# Altium footprint library custom-case.PcbLib: 381 footprints (part 14 of 24)
Each footprint in its own frame and in the unit in brackets; x right, y up, seen from the top. Pads: shape width x height; smd on the part's side, far side on the other; paste and mask are expansions set on the pad; w line width, h text height; cw(c..) or ccw(c..) is an arc to the next point about the centre after c.
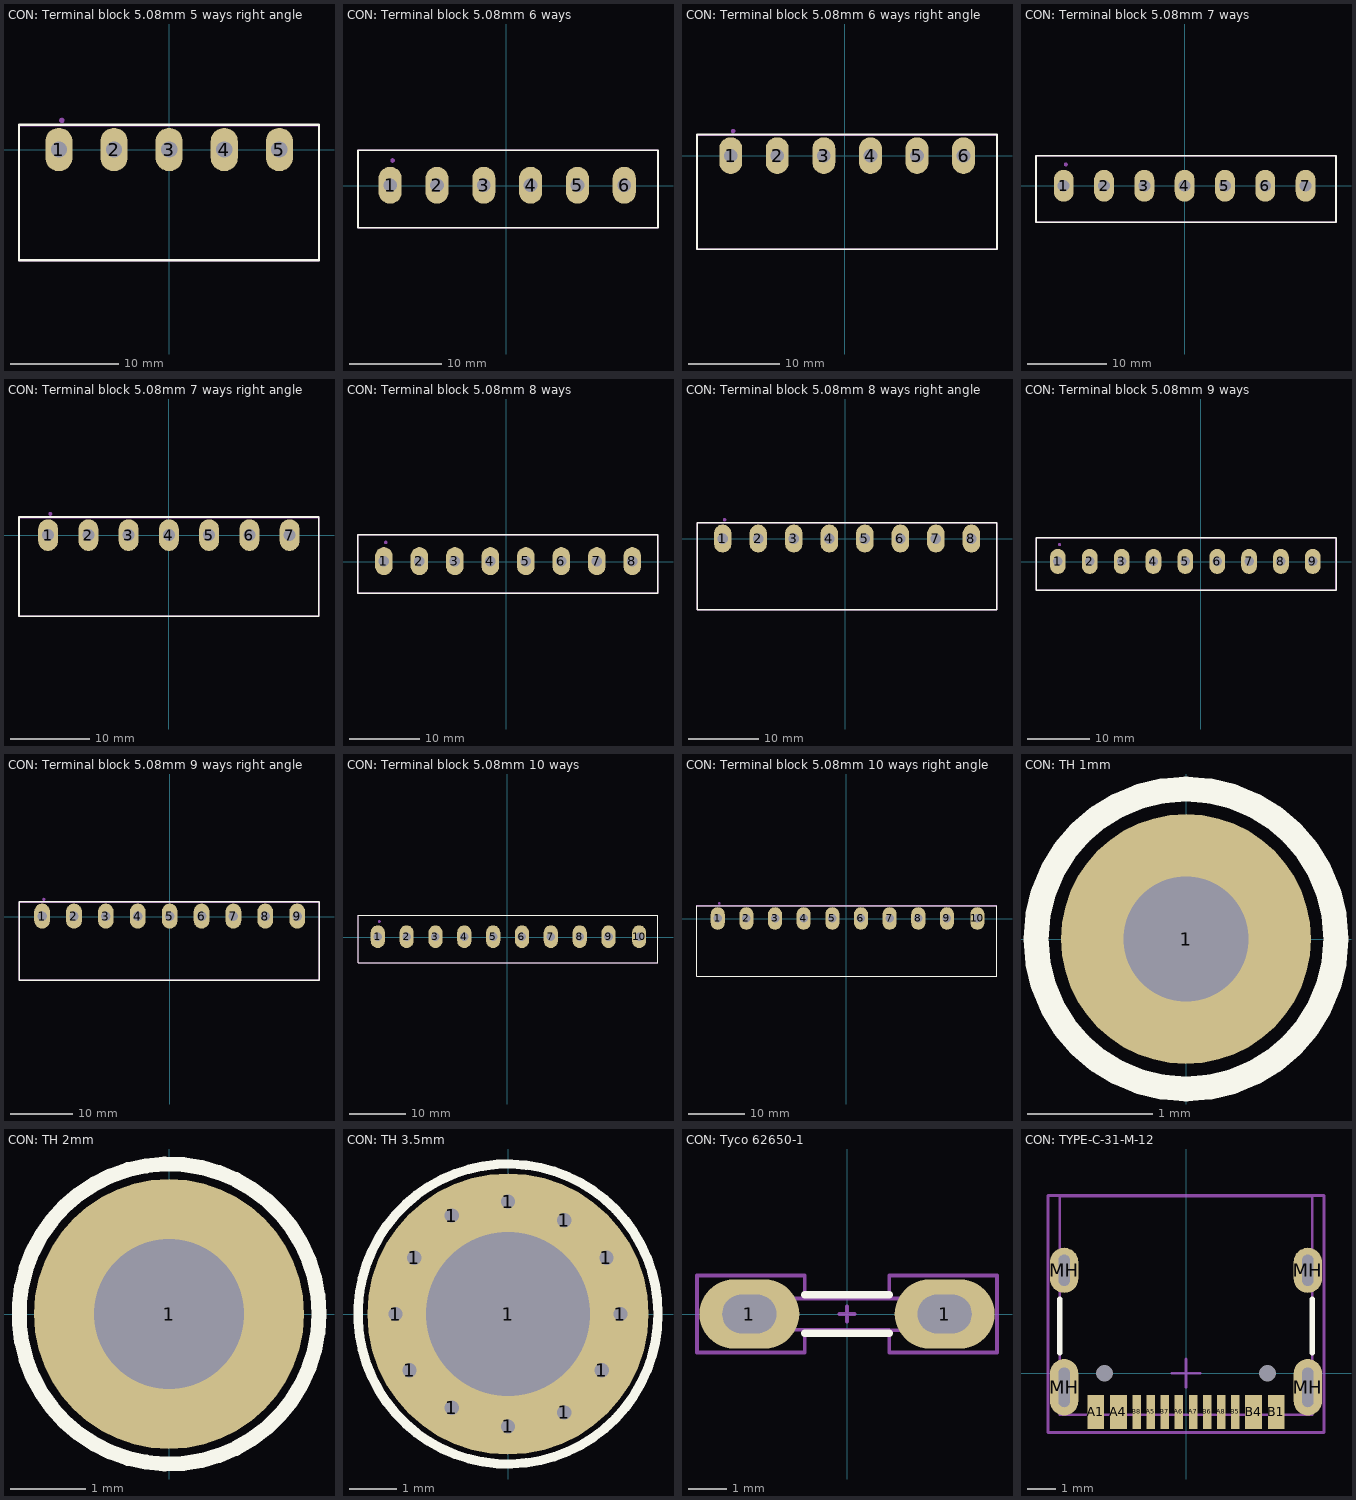
[diagram p13: the footprints below, top view; thin cyan lines are the x and y axes]

## CON: Terminal block 5.08mm 5 ways right angle [mm]
pads (6):
  oval 2.5x4 hole 1.5: 1(-10.16,0) 2(-5.08,0) 3(0,0) 4(5.08,0) 5(10.16,0)
  round 0.5 on Mech1: ""(-9.89,2.683)
Top Overlay:
  lines w0.2: -13.839,-10.213 -13.839,2.29 13.813,2.29 13.813,-10.213 -13.839,-10.213
Top Assy:
  lines w0.1: -13.839,-10.213 -13.839,2.302 13.813,2.302 13.813,-10.213 -13.839,-10.213
Size Area:
  lines w0.2: -13.839,-10.213 13.813,-10.213 13.813,2.228 -13.839,2.228 -13.839,-10.213
3D body "691313510005.stp": height 8.45, standoff -3.55, extent -13.713,-10.017 13.687,1.983

## CON: Terminal block 5.08mm 6 ways [mm]
pads (7):
  oval 2.5x4 hole 1.5: 1(-12.61,0.059) 2(-7.53,0.059) 3(-2.45,0.059) 4(2.63,0.059) 5(7.71,0.059) 6(12.79,0.059)
  round 0.5 on Mech1: ""(-12.34,2.741)
Top Overlay:
  lines w0.2: -16.1,-4.55 16.45,-4.55 16.45,3.85 -16.1,3.85 -16.1,-4.55
Top Assy:
  lines w0.1: -16.1,-4.55 16.45,-4.55 16.45,3.85 -16.1,3.85 -16.1,-4.55
Size Area:
  lines w0.2: -16.1,-4.55 -16.1,3.85 16.45,3.85 16.45,-4.55 -16.1,-4.55
3D body "691311500106.stp": height 12, standoff -4, extent -16.166,-4.633 16.314,3.867

## CON: Terminal block 5.08mm 6 ways right angle [mm]
pads (7):
  oval 2.5x4 hole 1.5: 1(-12.44,0) 2(-7.36,0) 3(-2.28,0) 4(2.8,0) 5(7.88,0) 6(12.96,0)
  round 0.5 on Mech1: ""(-12.17,2.683)
Top Overlay:
  lines w0.2: -16.119,-10.213 -16.119,2.29 16.611,2.29 16.611,-10.213 -16.119,-10.213
Top Assy:
  lines w0.1: -16.119,-10.213 -16.119,2.302 16.611,2.302 16.611,-10.213 -16.119,-10.213
Size Area:
  lines w0.2: -16.119,-10.213 16.611,-10.213 16.611,2.228 -16.119,2.228 -16.119,-10.213
3D body "691313510006.stp": height 8.45, standoff -3.55, extent -15.989,-9.989 16.491,2.011

## CON: Terminal block 5.08mm 7 ways [mm]
pads (8):
  oval 2.5x4 hole 1.5: 1(-15.24,0) 2(-10.16,0) 3(-5.08,0) 4(0,0) 5(5.08,0) 6(10.16,0) 7(15.24,0)
  round 0.5 on Mech1: ""(-14.97,2.683)
Top Overlay:
  lines w0.2: -18.73,-4.609 -18.73,3.791 19.07,3.791 19.07,-4.609 -18.73,-4.609
Top Assy:
  lines w0.1: -18.73,-4.609 -18.73,3.791 19.07,3.791 19.07,-4.609 -18.73,-4.609
Size Area:
  lines w0.2: -18.73,-4.609 19.07,-4.609 19.07,3.791 -18.73,3.791 -18.73,-4.609
3D body "691311500107.stp": height 12, standoff -4, extent -18.776,-4.691 18.784,3.809

## CON: Terminal block 5.08mm 7 ways right angle [mm]
pads (8):
  oval 2.5x4 hole 1.5: 1(-15.24,0) 2(-10.16,0) 3(-5.08,0) 4(0,0) 5(5.08,0) 6(10.16,0) 7(15.24,0)
  round 0.5 on Mech1: ""(-14.97,2.683)
Top Overlay:
  lines w0.2: -18.919,-10.213 -18.919,2.29 18.891,2.29 18.891,-10.213 -18.919,-10.213
Top Assy:
  lines w0.1: -18.919,-10.213 -18.919,2.302 18.944,2.302 18.944,-10.213 -18.919,-10.213
Size Area:
  lines w0.2: -18.919,-10.213 18.891,-10.213 18.891,2.228 -18.919,2.228 -18.919,-10.213
3D body "691313510007.stp": height 8.45, standoff -3.55, extent -18.78,-9.85 18.78,2.15

## CON: Terminal block 5.08mm 8 ways [mm]
pads (9):
  oval 2.5x4 hole 1.5: 1(-17.51,0.059) 2(-12.43,0.059) 3(-7.35,0.059) 4(-2.27,0.059) 5(2.81,0.059) 6(7.89,0.059) 7(12.97,0.059) 8(18.05,0.059)
  round 0.5 on Mech1: ""(-17.24,2.741)
Top Overlay:
  lines w0.2: -21.212,-4.55 -21.212,3.85 21.716,3.85 21.716,-4.55 -21.212,-4.55
Top Assy:
  lines w0.1: -21.212,-4.55 -21.212,3.85 21.733,3.85 21.733,-4.55 -21.212,-4.55
Size Area:
  lines w0.2: -21.212,-4.55 21.724,-4.55 21.724,3.85 -21.212,3.85 -21.212,-4.55
3D body "691311500108.stp": height 12, standoff -4, extent -21.056,-4.685 21.584,3.815

## CON: Terminal block 5.08mm 8 ways right angle [mm]
pads (9):
  oval 2.5x4 hole 1.5: 1(-17.52,0) 2(-12.44,0) 3(-7.36,0) 4(-2.28,0) 5(2.8,0) 6(7.88,0) 7(12.96,0) 8(18.04,0)
  round 0.5 on Mech1: ""(-17.25,2.683)
Top Overlay:
  lines w0.2: -21.199,-10.213 -21.199,2.29 21.7,2.29 21.7,-10.213 -21.199,-10.213
Top Assy:
  lines w0.1: -21.199,-10.213 -21.199,2.302 21.7,2.302 21.7,-10.213 -21.199,-10.213
Size Area:
  lines w0.2: -21.199,-10.213 21.7,-10.213 21.7,2.228 -21.199,2.228 -21.199,-10.213
3D body "691313510008.stp": height 8.45, standoff -3.55, extent -21,-9.85 21.64,2.15

## CON: Terminal block 5.08mm 9 ways [mm]
pads (10):
  oval 2.5x4 hole 1.5: 1(-22.76,0.059) 2(-17.68,0.059) 3(-12.6,0.059) 4(-7.52,0.059) 5(-2.44,0.059) 6(2.64,0.059) 7(7.72,0.059) 8(12.8,0.059) 9(17.88,0.059)
  round 0.5 on Mech1: ""(-22.49,2.741)
Top Overlay:
  lines w0.2: -26.25,-4.55 -26.25,3.85 21.583,3.85 21.583,-4.55 -26.25,-4.55
Top Assy:
  lines w0.1: -26.25,-4.55 -26.25,3.85 21.559,3.85 21.559,-4.55 -26.25,-4.55
Size Area:
  lines w0.2: -26.25,-4.55 21.559,-4.55 21.559,3.85 -26.25,3.85 -26.25,-4.55
3D body "691311500109.stp": height 12, standoff -4, extent -26.25,-4.55 21.47,3.95

## CON: Terminal block 5.08mm 9 ways right angle [mm]
pads (10):
  oval 2.5x4 hole 1.5: 1(-20.31,0.059) 2(-15.23,0.059) 3(-10.15,0.059) 4(-5.07,0.059) 5(0.01,0.059) 6(5.09,0.059) 7(10.17,0.059) 8(15.25,0.059) 9(20.33,0.059)
  round 0.5 on Mech1: ""(-20.04,2.741)
Top Overlay:
  lines w0.2: -23.989,-10.154 -23.989,2.348 23.8,2.348 23.8,-10.154 -23.989,-10.154
Top Assy:
  lines w0.1: -23.989,-10.154 -23.989,2.361 23.8,2.361 23.8,-10.154 -23.989,-10.154
Size Area:
  lines w0.2: -23.989,-10.154 23.8,-10.154 23.8,2.287 -23.989,2.287 -23.989,-10.154
3D body "691313510009.stp": height 8.45, standoff -3.55, extent -23.85,-9.85 23.87,2.15

## CON: Terminal block 5.08mm 10 ways [mm]
pads (11):
  oval 2.5x4 hole 1.5: 1(-22.76,0.059) 2(-17.68,0.059) 3(-12.6,0.059) 4(-7.52,0.059) 5(-2.44,0.059) 6(2.64,0.059) 7(7.72,0.059) 8(12.8,0.059) 9(17.88,0.059) 10(23.28,0.059)
  round 0.5 on Mech1: ""(-22.49,2.741)
Top Overlay:
  lines w0.2: -26.25,-4.55 26.6,-4.55 26.6,3.85 -26.25,3.85 -26.25,-4.55
Top Assy:
  lines w0.1: -26.25,-4.55 26.6,-4.55 26.6,3.85 -26.25,3.85 -26.25,-4.55
Size Area:
  lines w0.2: -26.25,-4.55 -26.25,3.85 26.6,3.85 26.6,-4.55 -26.25,-4.55
3D body "691311500110.stp": height 12, standoff -4, extent -26.334,-4.61 26.466,3.89

## CON: Terminal block 5.08mm 10 ways right angle [mm]
pads (11):
  oval 2.5x4 hole 1.5: 1(-22.76,0.059) 2(-17.68,0.059) 3(-12.6,0.059) 4(-7.52,0.059) 5(-2.44,0.059) 6(2.64,0.059) 7(7.72,0.059) 8(12.8,0.059) 9(17.88,0.059) 10(23.28,0.059)
  round 0.5 on Mech1: ""(-22.49,2.741)
Top Overlay:
  lines w0.2: -26.439,-10.154 26.761,-10.154 26.761,2.348 -26.439,2.348 -26.439,-10.154
Top Assy:
  lines w0.1: -26.439,-10.154 26.761,-10.154 26.761,2.361 -26.439,2.361 -26.439,-10.154
Size Area:
  lines w0.2: -26.439,-10.154 -26.439,2.287 26.761,2.287 26.761,-10.154 -26.439,-10.154
3D body "691313510010.stp": height 8.45, standoff -3.55, extent -26.3,-9.952 26.5,2.048

## CON: TH 1mm [mm]
pads (1):
  round 2 hole 1 mask+0.075: 1(0,0)
Top Overlay:
  circle w0.2: c0,0 r1.2
Size Area:
  circle w0.1: c0,0 r1.2
  lines w0.1: -0.5,0 0.5,0 ; 0,-0.5 0,0.5

## CON: TH 2mm [mm]
pads (1):
  round 3.6 hole 2 mask+0.075: 1(0,0)
Top Overlay:
  circle w0.2: c0,0 r2
Size Area:
  circle w0.1: c0,0 r2
  lines w0.1: -0.5,0 0.5,0 ; 0,-0.5 0,0.5

## CON: TH 3.5mm [mm]
pads (13):
  round 0.7 hole 0.3: 1(-2.4,0) 1(-2.1,-1.2) 1(-2,1.2) 1(-1.2,-2) 1(-1.2,2.1) 1(0,-2.4) 1(0,2.4) 1(1.2,-2.1) 1(1.2,2) 1(2,-1.2) 1(2.1,1.2) 1(2.4,0)
  round 6 hole 3.5: 1(0,0)
Top Overlay:
  circle w0.2: c0,0 r3.2

## CON: Tyco 62650-1 [mm]
pads (2):
  oval 2.6x1.8 hole 1 slot 1.4 at 0 deg mask+0.075: 1(-2.54,0) 1(2.54,0)
Top Overlay:
  lines w0.2: -1.1,-0.5 1.1,-0.5 ; -1.1,0.5 1.1,0.5
Top Assy:
  lines w0.1: -3.563,-0.405 -3.563,0.4 3.55,0.4 3.55,-0.425 -3.563,-0.405
Size Area:
  lines w0.1: -0.2,0 0.2,0 ; 0,-0.2 0,0.2 ; -3.9,-1 -3.9,1 -1.1,1 -1.1,0.4 1.1,0.4 1.1,1 3.9,1 3.9,-1 1.1,-1 1.1,-0.418 -1.1,-0.412 -1.1,-1 -3.9,-1
3D body "Tyco 62650-1 v2.step": height 9.24, standoff -3.13, extent -3.555,-0.4 3.555,0.4

## CON: TYPE-C-31-M-12 [mm]
pads (18):
  rect 0.6x1.2 smd mask+0.075: A1(-3.2,-1.375) A4(-2.4,-1.375) B1(3.2,-1.375) B4(2.4,-1.375)
  rect 0.3x1.2 smd mask+0.075: A5(-1.25,-1.375) A6(-0.25,-1.375) A7(0.25,-1.375) A8(1.25,-1.375) B5(1.75,-1.375) B6(0.75,-1.375) B7(-0.75,-1.375) B8(-1.75,-1.375)
  oval 1x2 hole 0.4 slot 1.4 at 90 deg mask+0.075: MH(-4.32,-0.5) MH(4.32,-0.5)
  oval 1x1.6 hole 0.4 slot 1.1 at 90 deg mask+0.075: MH(-4.32,3.65) MH(4.32,3.65)
  round 0 hole 0.6 mask+0.075: MH(-2.89,0) MH(2.89,0)
Top Overlay:
  lines w0.2: -4.475,0.725 -4.475,2.625 ; 4.475,0.725 4.475,2.625
Top Assy:
  lines w0.1: -4.475,-1.475 -4.475,6.275 4.475,6.275 4.475,-1.475 -4.475,-1.475
Size Area:
  lines w0.1: -0.5,0 0.5,0 ; 0,-0.5 0,0.5 ; -4.9,-2.1 4.9,-2.1 4.9,6.3 -4.9,6.3 -4.9,-2.1
3D body "User Library-USB - C.STEP": height 3.26, standoff -1, extent -4.475,-1.475 4.475,6.275